# Altium footprint library User.PcbLib: 317 footprints (part 12 of 20)
Each footprint in its own frame and in the unit in brackets; x right, y up, seen from the top. Pads: shape width x height; smd on the part's side, far side on the other; paste and mask are expansions set on the pad; w line width, h text height; cw(c..) or ccw(c..) is an arc to the next point about the centre after c.
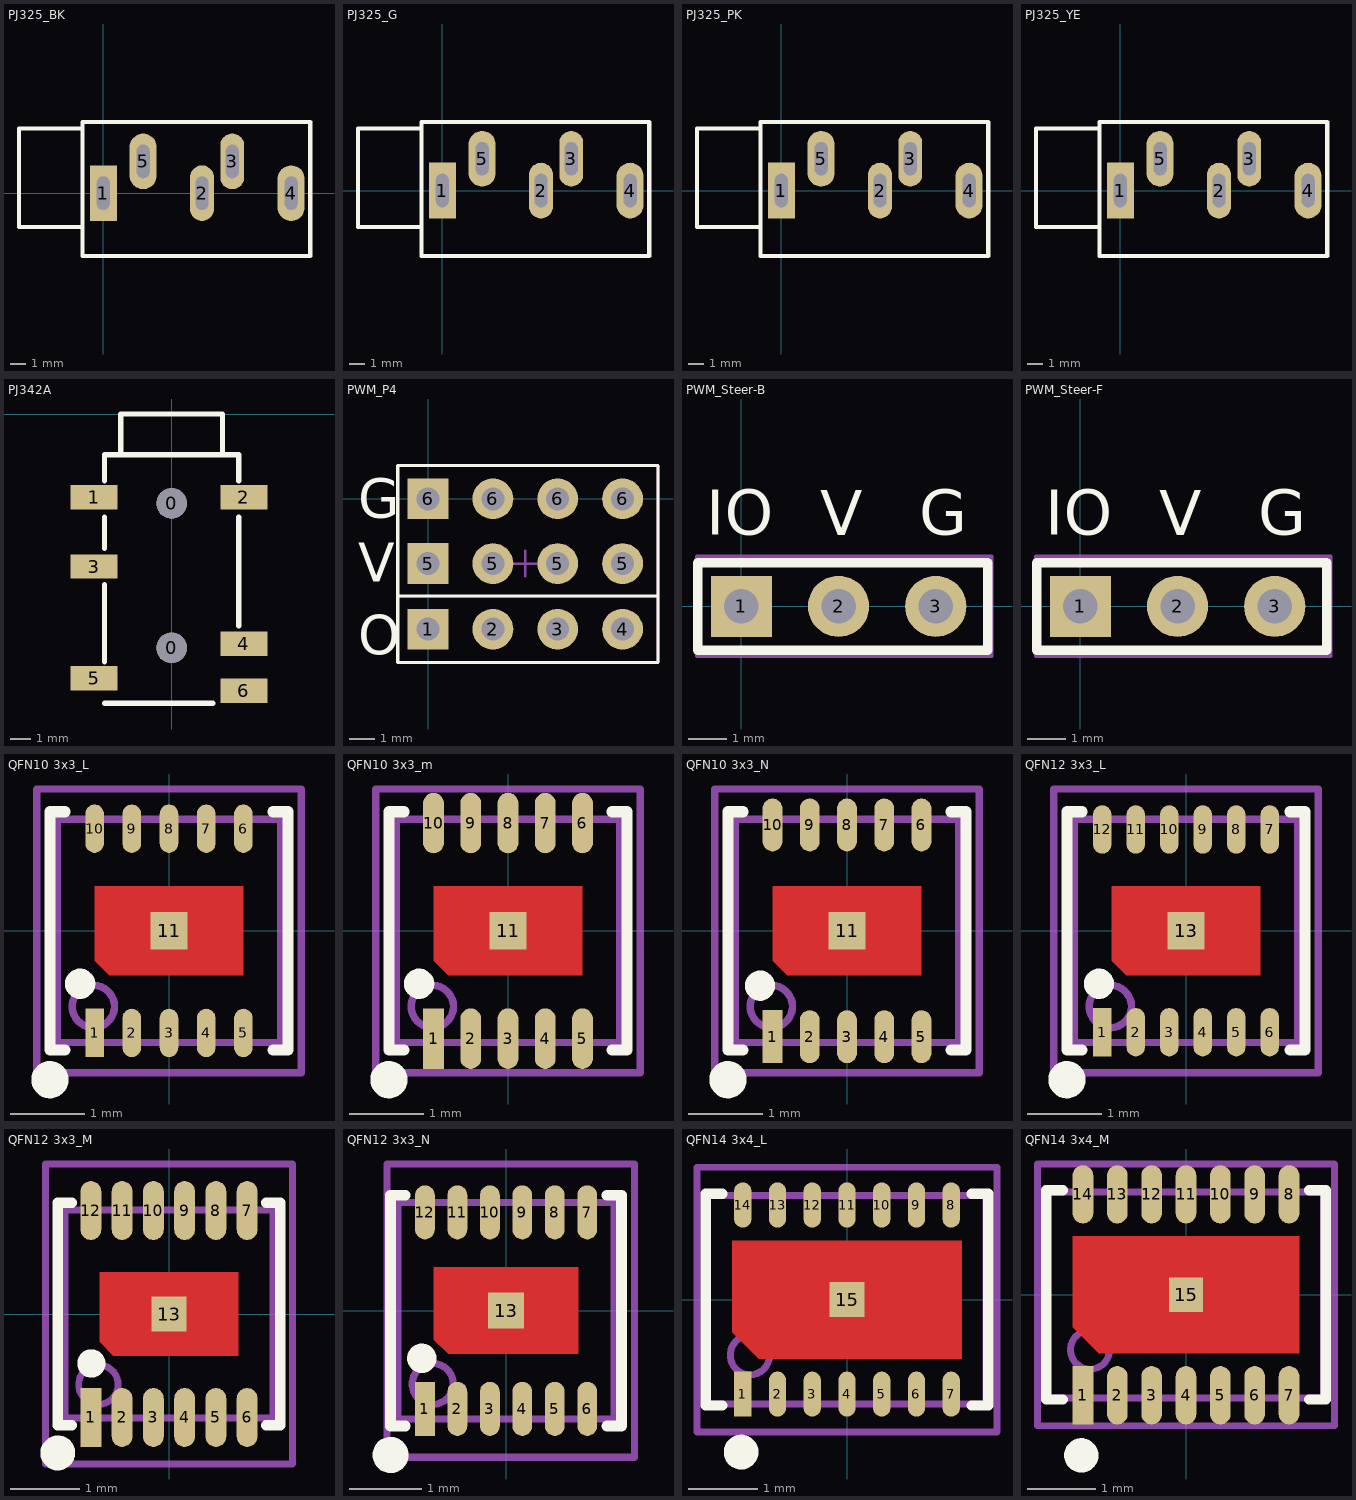
[diagram p11: the footprints below, top view; thin cyan lines are the x and y axes]

## PJ325_BK [mm] "黑色，18*8.1*12.3mm"
pads (5):
  rect 1.7x3.5 hole 0.8 slot 2.1 at 90 deg: 1(0,0)
  oval 1.5x3.5 hole 0.8 slot 2.1 at 90 deg: 2(6.2,0) 3(8.1,2)
  oval 1.7x3.5 hole 0.8 slot 2.1 at 90 deg: 4(11.8,0) 5(2.5,2)
Top Overlay:
  lines w0.254: -1.3,-2.136 -5.3,-2.136 -5.3,4.064 -1.3,4.064 ; -1.3,-3.936 -1.3,4.464 13,4.464 13,-3.936 -1.3,-3.936
3D body "PJ325_BK.STEP": height 12.35, standoff -2.9, extent -5.23,-3.9 12.8,4.2

## PJ325_G [mm] "绿色，18*8.1*12.3mm"
pads (5):
  rect 1.7x3.5 hole 0.8 slot 2.1 at 90 deg: 1(0,0)
  oval 1.5x3.5 hole 0.8 slot 2.1 at 90 deg: 2(6.2,0) 3(8.1,2)
  oval 1.7x3.5 hole 0.8 slot 2.1 at 90 deg: 4(11.8,0) 5(2.5,2)
Top Overlay:
  lines w0.254: -1.3,-2.3 -5.3,-2.3 -5.3,3.9 -1.3,3.9 ; -1.3,-4.1 -1.3,4.3 13,4.3 13,-4.1 -1.3,-4.1
3D body "PJ325_G.STEP": height 12.35, standoff -2.9, extent -5.23,-3.9 12.8,4.2

## PJ325_PK [mm] "粉色，18*8.1*12.3mm"
pads (5):
  rect 1.7x3.5 hole 0.8 slot 2.1 at 90 deg: 1(0,0)
  oval 1.5x3.5 hole 0.8 slot 2.1 at 90 deg: 2(6.2,0) 3(8.1,2)
  oval 1.7x3.5 hole 0.8 slot 2.1 at 90 deg: 4(11.8,0) 5(2.5,2)
Top Overlay:
  lines w0.254: -1.3,-2.3 -5.3,-2.3 -5.3,3.9 -1.3,3.9 ; -1.3,-4.1 -1.3,4.3 13,4.3 13,-4.1 -1.3,-4.1
3D body "PJ325_PK.STEP": height 12.35, standoff -2.9, extent -5.23,-3.9 12.8,4.2

## PJ325_YE [mm] "黄色，18*8.1*12.3mm"
pads (5):
  rect 1.7x3.5 hole 0.8 slot 2.1 at 90 deg: 1(0,0)
  oval 1.5x3.5 hole 0.8 slot 2.1 at 90 deg: 2(6.2,0) 3(8.1,2)
  oval 1.7x3.5 hole 0.8 slot 2.1 at 90 deg: 4(11.8,0) 5(2.5,2)
Top Overlay:
  lines w0.254: -1.3,-2.3 -5.3,-2.3 -5.3,3.9 -1.3,3.9 ; -1.3,-4.1 13,-4.1 13,4.3 -1.3,4.3 -1.3,-4.1
3D body "PJ325_YE.STEP": height 12.35, standoff -2.9, extent -5.23,-3.9 12.8,4.2

## PJ342A [mm] "有头"
pads (8):
  round 1.5 hole 1.5: 0(0,-11.5) 0(0,-4.4)
  rect 2.3x1.2 smd: 1(-3.81,-4.1) 2(3.556,-4.1) 3(-3.81,-7.5) 4(3.556,-11.3) 5(-3.81,-13) 6(3.556,-13.6)
Top Overlay:
  lines w0.254: -3.302,-14.224 2.032,-14.224 ; -3.302,-12.192 -3.302,-8.382 ; -3.302,-6.604 -3.302,-5.08 ; -3.302,-3.302 -3.302,-2 3.302,-2 3.302,-3.302 ; -2.5,-2 -2.5,0 2.5,0 2.5,-2 ; 3.302,-10.414 3.302,-5.08
3D body "PJ342A.STEP": height 4.7, standoff -0.6, extent -4.15,-14.1 4.15,0

## PWM_P4 [mm]
pads (12):
  rect 1.6x1.6 hole 0.9: 1(0,-5.11) 5(0,-2.54) 6(0,0)
  round 1.6 hole 0.9: 2(2.54,-5.11) 3(5.08,-5.11) 4(7.62,-5.11) 5(2.54,-2.54) 5(5.08,-2.54) 5(7.62,-2.54) 6(2.54,0) 6(5.08,0) 6(7.62,0)
Top Overlay:
  lines w0.127: -1.19,-3.81 8.987,-3.81 ; -1.19,-6.41 9.01,-6.41 9.01,1.3 -1.19,1.3 -1.19,-6.41
  text "G" at -2.746,-0.746 h1.52
  text "V" at -2.746,-3.246 h1.52
  text "O" at -2.746,-6.084 h1.52
Mechanical 15:
  lines w0.1: -1.19,-3.84 -1.19,-1.24 ; -1.19,-1.3 -1.19,1.3 9.01,1.3 9.01,-1.3 ; 3.31,-2.54 4.31,-2.54 ; 3.81,-3.04 3.81,-2.04 ; 9.01,-3.84 9.01,-1.24 ; -1.19,-6.41 -1.19,-3.81 9.01,-3.81 9.01,-6.41 ; -1.19,-6.41 9.01,-6.41 ; -1.19,-6.41 9.01,-6.41
3D body "HEADER 2.54X4.stp": height 8.3, standoff -2.9, extent -1.143,-1.228 9.017,1.27
3D body "HEADER 2.54X4.stp": height 8.3, standoff -2.9, extent -1.143,-3.768 9.017,-1.27
3D body "HEADER 2.54X4.stp": height 8.3, standoff -2.9, extent -1.143,-6.338 9.017,-3.84

## PWM_Steer-B [mm]
pads (3):
  rect 1.6x1.6 hole 0.9: 1(0,0)
  round 1.6 hole 0.9: 2(2.54,0) 3(5.08,0)
Top Overlay:
  lines w0.254: -1.143,-1.143 -1.143,1.143 6.44,1.143 6.44,-1.143 -1.143,-1.143
  text "V" at 2.057,1.467 h2.03
  text "IO" at -0.913,1.484 h2.03
  text "G" at 4.648,1.484 h2.03
Bottom Overlay:
  text "G" at 5.512,1.484 h2.03
  text "V" at 3.023,1.467 h2.03
  text "IO" at 0.912,1.473 h2.03
Mechanical 15:
  lines w0.1: -1.16,-1.3 -1.16,1.3 6.54,1.3 6.54,-1.3 -1.16,-1.3
3D body "HEADER 3H.STEP": height 4.43, standoff -2.9, extent -1.27,-7.01 6.35,1.26

## PWM_Steer-F [mm]
pads (3):
  rect 1.6x1.6 hole 0.9: 1(0,0)
  round 1.6 hole 0.9: 2(2.54,0) 3(5.08,0)
Top Overlay:
  lines w0.254: -1.143,-1.143 -1.143,1.143 6.44,1.143 6.44,-1.143 -1.143,-1.143
  text "IO" at -0.913,1.484 h2.03
  text "V" at 2.057,1.467 h2.03
  text "G" at 4.648,1.484 h2.03
Mechanical 15:
  lines w0.1: -1.16,-1.3 -1.16,1.3 6.54,1.3 6.54,-1.3 -1.16,-1.3
3D body "HEADER 3H.STEP": height 4.43, standoff -2.9, extent -1.27,-7.01 6.35,1.26

## QFN10 3x3_L [mm] "10脚，长x宽x高：3x3x0.6mm，脚距：0.5mm"
pads (11):
  rect 0.25x0.65 smd: 1(-1,-1.372)
  oval 0.25x0.65 smd: 2(-0.5,-1.372) 3(0,-1.372) 4(0.5,-1.372) 5(1,-1.372) 6(1,1.372) 7(0.5,1.372) 8(0,1.372) 9(-0.5,1.372) 10(-1,1.372)
  rect 0.5x0.5 smd: 11(0,0)
Top Layer:
  region: -1,0.6 1,0.6 1,-0.6 -0.8,-0.6 -1,-0.4
Top Overlay:
  circle w0.25: c-1.6,-2 r0.125
  circle w0.203: c-1.194,-0.711 r0.102
  lines w0.15: -1.397,-1.6 -1.6,-1.6 -1.6,1.6 -1.397,1.6 ; 1.397,-1.6 1.6,-1.6 1.6,1.6 1.397,1.6
Top Solder:
  region: -1,0.6 1,0.6 1,-0.6 -0.8,-0.6 -1,-0.4
Mechanical 13:
  circle w0.1: c-1.016,-1.016 r0.284
  lines w0.1: 1.5,-1.5 1.5,1.5 ; 1.5,-1.5 1.5,-1.5 ; 1.5,-1.5 -1.49,-1.5 -1.5,-1.51 -1.5,1.5 1.5,1.5 ; 1.5,1.5 1.5,1.5
Mechanical 15:
  circle w0.05: c0,0 r0.35
  lines w0.05: -0.5,0 0.5,0 ; 0,-0.5 0,0.5
  lines w0.1: -1.778,-1.905 1.778,-1.905 1.778,1.905 -1.778,1.905 -1.778,-1.905
3D body "QFN10 3x3.STEP": height 0.63, standoff 0.01, extent -1.5,-1.52 1.5,1.52

## QFN10 3x3_m [mil] "10脚，长x宽x高：3x3x0.6mm，脚距：0.5mm"
pads (11):
  rect 11x32 smd: 1(-39.37,-57)
  oval 11x32 smd: 2(-19.68,-57) 3(0,-57) 4(19.68,-57) 5(39.37,-57) 6(39.37,57) 7(19.68,57) 8(0,57) 9(-19.68,57) 10(-39.37,57)
  rect 19.68x19.68 smd: 11(0,0)
Top Layer:
  region: -39.37,23.62 39.37,23.62 39.37,-23.62 -31.5,-23.62 -39.37,-15.75
Top Overlay:
  circle w9.84: c-62.99,-78.74 r4.92
  circle w8: c-47,-28 r4
  lines w5.91: -55,-62.99 -62.99,-62.99 -62.99,62.99 -55,62.99 ; 55,-62.99 62.99,-62.99 62.99,62.99 55,62.99
Top Solder:
  region: -39.37,23.62 39.37,23.62 39.37,-23.62 -31.5,-23.62 -39.37,-15.75
Mechanical 13:
  circle w3.94: c-40,-40 r11.18
  lines w3.94: 59.05,-59.05 59.05,59.05 ; 59.05,-59.05 59.06,-59.06 ; 59.06,-59.06 -58.66,-59.06 -59.06,-59.45 -59.06,59.06 59.05,59.06 ; 59.05,59.06 59.05,59.05
Mechanical 15:
  circle w1.97: c0,0 r13.78
  lines w1.97: -19.68,0 19.68,0 ; 0,-19.68 0,19.68
  lines w3.94: -70,-75 70,-75 70,75 -70,75 -70,-75
3D body "QFN10 3x3.STEP": height 24.8, standoff 0.39, extent -59.06,-59.85 59.05,59.84

## QFN10 3x3_N [mil] "10脚，长x宽x高：3x3x0.6mm，脚距：0.5mm"
pads (11):
  rect 10.5x28 smd: 1(-39.37,-56)
  oval 10.5x28 smd: 2(-19.68,-56) 3(0,-56) 4(19.68,-56) 5(39.37,-56) 6(39.37,56) 7(19.68,56) 8(0,56) 9(-19.68,56) 10(-39.37,56)
  rect 19.68x19.68 smd: 11(0,0)
Top Layer:
  region: -39.37,23.62 39.37,23.62 39.37,-23.62 -31.5,-23.62 -39.37,-15.75
Top Overlay:
  circle w8: c-46,-29 r4
  circle w9.84: c-62.99,-78.74 r4.92
  lines w5.91: -55,-62.99 -62.99,-62.99 -62.99,62.99 -55,62.99 ; 55,-62.99 62.99,-62.99 62.99,62.99 55,62.99
Top Solder:
  region: -39.37,23.62 39.37,23.62 39.37,-23.62 -31.5,-23.62 -39.37,-15.75
Mechanical 13:
  circle w3.94: c-40,-40 r11.18
  lines w3.94: 59.06,-59.06 -58.66,-59.06 -59.06,-59.45 -59.06,59.06 59.05,59.06 ; 59.05,-59.05 59.06,-59.06 ; 59.05,-59.05 59.05,59.05 ; 59.05,59.06 59.05,59.05
Mechanical 15:
  circle w1.97: c0,0 r13.78
  lines w1.97: -19.68,0 19.68,0 ; 0,-19.68 0,19.68
  lines w3.94: -70,-75 -70,75 70,75 70,-75 -70,-75
3D body "QFN10 3x3.STEP": height 24.8, standoff 0.39, extent -59.06,-59.85 59.05,59.84

## QFN12 3x3_L [mm] "12脚，长x宽x高：3x3x0.6mm，脚距：0.45mm"
pads (13):
  rect 0.25x0.65 smd: 1(-1.125,-1.362)
  oval 0.25x0.65 smd: 2(-0.675,-1.362) 3(-0.225,-1.362) 4(0.225,-1.362) 5(0.675,-1.362) 6(1.125,-1.362) 7(1.125,1.362) 8(0.675,1.362) 9(0.225,1.362) 10(-0.225,1.362) 11(-0.675,1.362) 12(-1.125,1.362)
  rect 0.5x0.5 smd: 13(0,0)
Top Layer:
  region: -1,0.6 1,0.6 1,-0.6 -0.8,-0.6 -1,-0.4
Top Overlay:
  circle w0.25: c-1.6,-2 r0.125
  circle w0.203: c-1.168,-0.711 r0.102
  lines w0.15: -1.397,-1.6 -1.6,-1.6 -1.6,1.6 -1.397,1.6 ; 1.397,-1.6 1.6,-1.6 1.6,1.6 1.397,1.6
Top Solder:
  region: -1,0.6 1,0.6 1,-0.6 -0.8,-0.6 -1,-0.4
Mechanical 13:
  circle w0.1: c-1.016,-1.016 r0.284
  lines w0.1: 1.5,-1.5 -1.49,-1.5 -1.5,-1.51 -1.5,1.5 1.5,1.5 ; 1.5,-1.5 1.5,-1.5 ; 1.5,-1.5 1.5,1.5 ; 1.5,1.5 1.5,1.5
Mechanical 15:
  circle w0.05: c0,0 r0.35
  lines w0.05: -0.5,0 0.5,0 ; 0,-0.5 0,0.5
  lines w0.1: -1.778,-1.905 -1.778,1.905 1.778,1.905 1.778,-1.905 -1.778,-1.905
3D body "QFN12 3x3.STEP": height 0.63, standoff 0, extent -1.5,-1.501 1.5,1.501

## QFN12 3x3_M [mm] "12脚，长x宽x高：3x3x0.6mm，脚距：0.45mm"
pads (13):
  rect 0.3x0.85 smd: 1(-1.125,-1.489)
  oval 0.3x0.85 smd: 2(-0.675,-1.489) 3(-0.225,-1.489) 4(0.225,-1.489) 5(0.675,-1.489) 6(1.125,-1.489) 7(1.125,1.489) 8(0.675,1.489) 9(0.225,1.489) 10(-0.225,1.489) 11(-0.675,1.489) 12(-1.125,1.489)
  rect 0.5x0.5 smd: 13(0,0)
Top Layer:
  region: -1,0.6 1,0.6 1,-0.6 -0.8,-0.6 -1,-0.4
Top Overlay:
  circle w0.25: c-1.6,-2 r0.125
  circle w0.203: c-1.118,-0.711 r0.102
  lines w0.15: -1.397,-1.6 -1.6,-1.6 -1.6,1.6 -1.397,1.6 ; 1.397,-1.6 1.6,-1.6 1.6,1.6 1.397,1.6
Top Solder:
  region: -1,0.6 1,0.6 1,-0.6 -0.8,-0.6 -1,-0.4
Mechanical 13:
  circle w0.1: c-1.016,-1.016 r0.284
  lines w0.1: 1.5,-1.5 1.5,1.5 ; 1.5,-1.5 1.5,-1.5 ; 1.5,-1.5 -1.49,-1.5 -1.5,-1.51 -1.5,1.5 1.5,1.5 ; 1.5,1.5 1.5,1.5
Mechanical 15:
  circle w0.05: c0,0 r0.35
  lines w0.05: -0.5,0 0.5,0 ; 0,-0.5 0,0.5
  lines w0.1: -1.778,-2.159 -1.778,2.159 1.778,2.159 1.778,-2.159 -1.778,-2.159
3D body "QFN12 3x3.STEP": height 0.63, standoff 0, extent -1.5,-1.501 1.5,1.501

## QFN12 3x3_N [mm] "12脚，长x宽x高：3x3x0.6mm，脚距：0.45mm"
pads (13):
  rect 0.275x0.75 smd: 1(-1.125,-1.362)
  oval 0.275x0.75 smd: 2(-0.675,-1.362) 3(-0.225,-1.362) 4(0.225,-1.362) 5(0.675,-1.362) 6(1.125,-1.362) 7(1.125,1.362) 8(0.675,1.362) 9(0.225,1.362) 10(-0.225,1.362) 11(-0.675,1.362) 12(-1.125,1.362)
  rect 0.5x0.5 smd: 13(0,0)
Top Layer:
  region: -1,0.6 1,0.6 1,-0.6 -0.8,-0.6 -1,-0.4
Top Overlay:
  circle w0.25: c-1.6,-2 r0.125
  circle w0.203: c-1.168,-0.66 r0.102
  lines w0.15: -1.397,-1.6 -1.6,-1.6 -1.6,1.6 -1.397,1.6 ; 1.397,-1.6 1.6,-1.6 1.6,1.6 1.397,1.6
Top Solder:
  region: -1,0.6 1,0.6 1,-0.6 -0.8,-0.6 -1,-0.4
Mechanical 13:
  circle w0.1: c-1.016,-1.016 r0.284
  lines w0.1: 1.5,-1.5 -1.49,-1.5 -1.5,-1.51 -1.5,1.5 1.5,1.5 ; 1.5,-1.5 1.5,-1.5 ; 1.5,-1.5 1.5,1.5 ; 1.5,1.5 1.5,1.5
Mechanical 15:
  circle w0.05: c0,0 r0.35
  lines w0.05: -0.5,0 0.5,0 ; 0,-0.5 0,0.5
  lines w0.1: -1.651,-2.032 -1.651,2.032 1.778,2.032 1.778,-2.032 -1.651,-2.032
3D body "QFN12 3x3.STEP": height 0.63, standoff 0, extent -1.5,-1.501 1.5,1.501

## QFN14 3x4_L [mm] "14脚，长x宽x高：3x4x0.9mm，脚距：0.5mm"
pads (15):
  rect 0.25x0.65 smd: 1(-1.5,-1.361)
  oval 0.25x0.65 smd: 2(-1,-1.361) 3(-0.5,-1.361) 4(0,-1.361) 5(0.5,-1.361) 6(1,-1.361) 7(1.5,-1.361) 8(1.5,1.361) 9(1,1.361) 10(0.5,1.361) 11(0,1.361) 12(-0.5,1.361) 13(-1,1.361) 14(-1.5,1.361)
  rect 0.5x0.5 smd: 15(0,0)
Top Layer:
  region: -1.65,0.85 -1.65,-0.469 -1.269,-0.85 1.65,-0.85 1.65,0.85
Top Overlay:
  circle w0.25: c-1.524,-2.195 r0.125
  lines w0.15: -1.793,-1.524 -2.032,-1.524 -2.032,1.524 -1.793,1.524 ; 1.793,-1.524 2.032,-1.524 2.032,1.524 1.793,1.524
Top Solder:
  region: -1.65,0.85 -1.65,-0.469 -1.269,-0.85 1.65,-0.85 1.65,0.85
Mechanical 13:
  circle w0.1: c-1.397,-0.798 r0.284
  lines w0.1: -2.032,-1.5 -1.49,-1.5 2,-1.5 2,0.682 2.001,0.683 2.001,1.5 -2.032,1.5 -2.032,-1.5
Mechanical 15:
  circle w0.05: c0,0 r0.35
  lines w0.05: -0.5,0 0.5,0 ; 0,-0.5 0,0.5
  lines w0.1: -2.159,-1.905 2.159,-1.905 2.159,1.905 -2.159,1.905 -2.159,-1.905
3D body "QFN14 3x4.STEP": height 0.93, standoff 0, extent -2,-1.501 2,1.501

## QFN14 3x4_M [mm] "14脚，长x宽x高：3x4x0.9mm，脚距：0.5mm"
pads (15):
  rect 0.3x0.85 smd: 1(-1.5,-1.462)
  oval 0.3x0.85 smd: 2(-1,-1.462) 3(-0.5,-1.462) 4(0,-1.462) 5(0.5,-1.462) 6(1,-1.462) 7(1.5,-1.462) 8(1.5,1.463) 9(1,1.463) 10(0.5,1.463) 11(0,1.463) 12(-0.5,1.463) 13(-1,1.463) 14(-1.5,1.463)
  rect 0.5x0.5 smd: 15(0,0)
Top Layer:
  region: -1.65,0.85 -1.65,-0.469 -1.269,-0.85 1.65,-0.85 1.65,0.85
Top Overlay:
  circle w0.25: c-1.524,-2.337 r0.125
  lines w0.15: -1.793,-1.524 -2.032,-1.524 -2.032,1.524 -1.793,1.524 ; 1.793,-1.524 2.032,-1.524 2.032,1.524 1.793,1.524
Top Solder:
  region: -1.65,0.85 -1.65,-0.469 -1.269,-0.85 1.65,-0.85 1.65,0.85
Mechanical 13:
  circle w0.1: c-1.397,-0.798 r0.284
  lines w0.1: -2.032,-1.5 -2.032,1.5 2.001,1.5 2.001,0.683 2,0.682 2,-1.5 -1.49,-1.5 -2.032,-1.5
Mechanical 15:
  circle w0.05: c0,0 r0.35
  lines w0.05: -0.5,0 0.5,0 ; 0,-0.5 0,0.5
  lines w0.1: -2.159,-1.905 -2.159,1.905 2.159,1.905 2.159,-1.905 -2.159,-1.905
3D body "QFN14 3x4.STEP": height 0.93, standoff 0, extent -2,-1.501 2,1.501